# Altium footprint library PcbLib1.PcbLib: 45 footprints (part 2 of 3)
Each footprint in its own frame and in the unit in brackets; x right, y up, seen from the top. Pads: shape width x height; smd on the part's side, far side on the other; paste and mask are expansions set on the pad; w line width, h text height; cw(c..) or ccw(c..) is an arc to the next point about the centre after c.
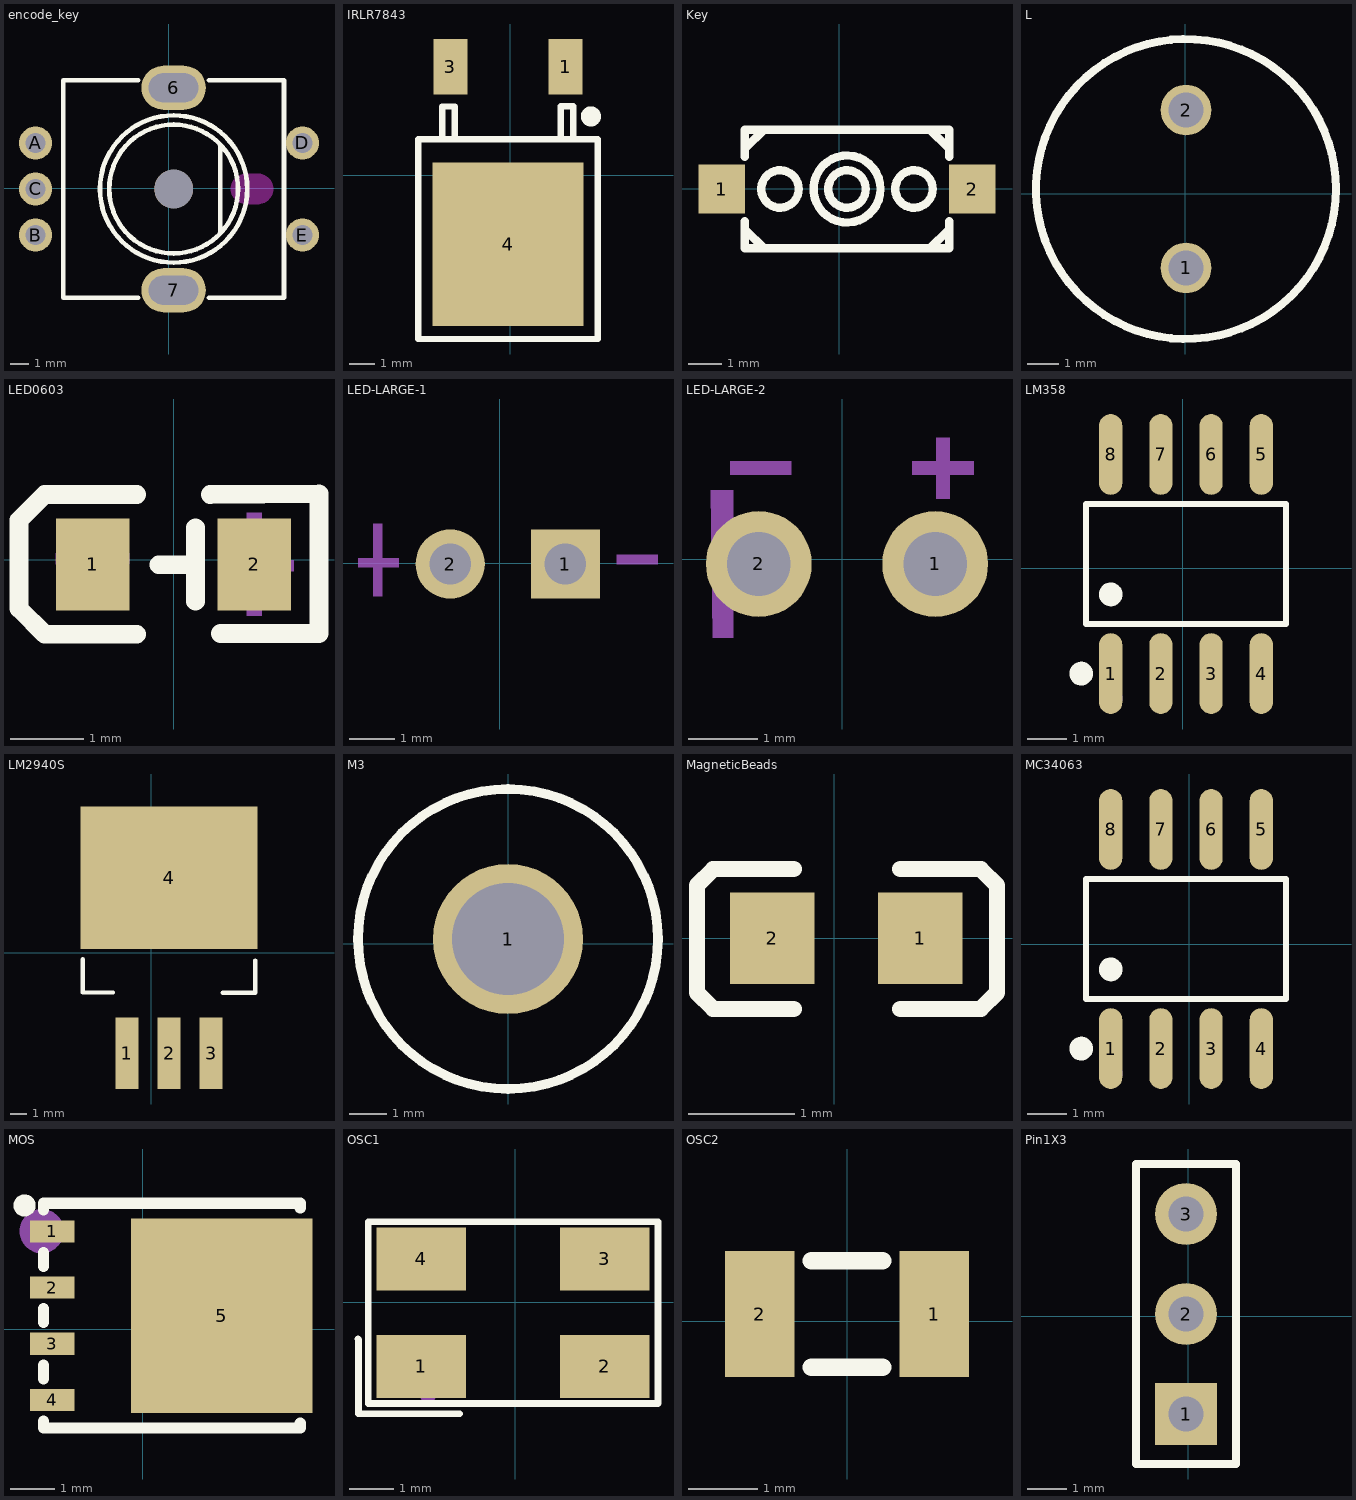
[diagram p1: the footprints below, top view; thin cyan lines are the x and y axes]

## encode_key [mm] "编码器开关"
pads (8):
  oval 3.5x2.4 hole 1.6 slot 2.7 at 0 deg: 6(0.253,5.449) 7(0.253,-5.551)
  round 1.8 hole 1.1: A(-7.247,2.449) B(-7.247,-2.551) C(-7.247,-0.051) D(7.253,2.449) E(7.253,-2.551)
  round 2.1 hole 2.1 unplated: ""(0.253,-0.051)
Top Overlay:
  circle w0.254: c0.253,-0.051 r4
  circle w0.254: c0.253,-0.051 r3.5
  lines w0.254: -5.747,5.849 -5.747,-5.951 -1.671,-5.951 ; -5.677,5.849 -1.671,5.849 ; 2.177,-5.951 6.253,-5.951 6.253,5.849 2.177,5.849 ; 2.793,-2.371 2.793,2.359
Keep-Out Layer:
  board cut-out: 4.133,0.779 4.895,0.779 4.998,0.771 5.194,0.704 5.368,0.591 5.508,0.439 5.606,0.258 5.657,0.057 5.657,-0.15 5.606,-0.35 5.508,-0.532 5.368,-0.684 5.194,-0.797 4.998,-0.864 4.895,-0.872 4.133,-0.872 4.03,-0.864 3.834,-0.797 3.661,-0.684 3.521,-0.532 3.422,-0.35 3.371,-0.15 3.371,0.057 3.422,0.258 3.521,0.439 3.661,0.591 3.834,0.704 4.03,0.771
3D body "SW5.step": height 21.49, standoff -3.51, extent -7.514,-6.865 7.386,5.976
3D body: height 0.25, standoff 0, extent 0,-0.508 0.254,-0.127

## IRLR7843 [mm]
pads (3):
  rect 1.35x2.2 smd: 1(2.206,4.319) 3(-2.374,4.319)
  rect 6x6.5 smd: 4(-0.084,-2.748)
Top Overlay:
  lines w0.254: -2.707,1.433 -2.707,2.733 -2.207,2.733 -2.207,1.433 ; 2.016,1.437 2.016,2.737 2.516,2.737 2.516,1.437 ; -3.657,-6.513 -3.657,1.437 3.489,1.437 3.489,-6.513 -3.657,-6.513
  lines w0.4: 3.015,2.338 ccw(c3.215,2.339) 3.015,2.34
Mechanical 15:
  circle w0.3: c2.329,4.799 r0.15
3D body "IRLR7843.step": height -0.64, standoff -2.94, extent -3.298,-5.406 3.202,4.513

## Key [mm]
pads (2):
  rect 1.4x1.5 smd: 1(-3.571,0) 2(4.029,0)
Top Overlay:
  circle w0.254: c0.229,0 r0.568
  circle w0.254: c0.229,0 r1.016
  circle w0.254: c2.261,0 r0.568
  circle w0.254: c-1.803,0 r0.568
  lines w0.254: -2.871,-0.981 -2.871,-1.8 3.329,-1.8 3.329,-0.981 ; -2.871,0.981 -2.871,1.8 3.329,1.8 3.329,0.981 ; -2.819,-1.27 -2.311,-1.778 ; -2.819,1.27 -2.311,1.778 ; 2.769,-1.778 3.277,-1.27 ; 2.769,1.778 3.277,1.27
3D body "SW3.step": height 2.6, standoff 0, extent -3.632,-1.927 4.268,1.674
3D body: height 0.25, standoff 0, extent -4.445,-1.778 -4.445,-1.778

## L [mm]
pads (2):
  round 1.6 hole 1.1: 1(0.02,-2.355) 2(0.02,2.645)
Top Overlay:
  circle w0.254: c0.02,0.145 r4.75
3D body "L.step": height 12.5, standoff -5, extent -4.704,-4.613 4.806,4.887

## LED0603 [mm]
pads (2):
  rect 1x1.25 smd: 1(-1.104,-0.061) 2(1.096,-0.061)
Top Overlay:
  lines w0.254: -0.504,-1.011 -1.754,-1.011 ; -0.504,0.889 -1.754,0.889 ; -0.204,-0.066 0.296,-0.066 ; 0.296,-0.561 0.296,0.439 ; 0.496,0.889 1.976,0.899 1.976,-1.001 0.636,-1.001 ; -1.754,-1.011 -2.104,-0.661 -2.104,0.539 -1.754,0.889 ; -1.754,-1.011 -1.754,-1.011 ; -1.754,0.889 -1.754,0.889
Mechanical 15:
  region: -1.604,-0.061 -0.604,-0.061 -0.604,0.089 -1.604,0.089
  region: 0.631,-0.155 1.631,-0.155 1.631,-0.005 0.631,-0.005
  region: 0.996,0.639 1.196,0.639 1.196,-0.761 0.996,-0.761
3D body "LED3.step": height 1.01, standoff 0, extent -1.01,-0.752 1.01,0.508

## LED-LARGE-1 [mil]
pads (2):
  rect 60x60 hole 36: 1(56.95,-0.6)
  round 60 hole 36: 2(-43.05,-0.6)
Bottom Overlay:
  circle w7.87: c6.95,-0.6 r86.61
  region: -102.02,34.56 -109.89,34.56 -109.89,-28.43 -102.02,-28.43
  region: 137.25,7.56 101.82,7.56 101.82,-0.32 137.25,-0.32
  region: -87.46,4.91 -122.89,4.91 -122.89,-2.97 -87.46,-2.97
  lines w10: -18.05,49.4 -18.05,64.4 ; -3.05,64.4 -8.05,64.4 -18.05,64.4 ; 1.95,44.4 -18.05,64.4 ; 16.95,49.4 16.95,64.4 ; 31.95,64.4 26.95,64.4 16.95,64.4 ; 36.95,44.4 16.95,64.4
Mechanical 15:
  region: 136.87,7.27 101.44,7.27 101.44,-0.6 136.87,-0.6
  region: -87.62,4.46 -123.05,4.46 -123.05,-3.42 -87.62,-3.42
  region: -101.84,34.28 -109.71,34.28 -109.71,-28.71 -101.84,-28.71
3D body "LED_LARGE1.step": height 117.8, standoff -236.53, extent -54.55,-78.56 87.12,74.76

## LED-LARGE-2 [mil]
pads (2):
  round 60 hole 36: 1(52.71,-2.7) 2(-47.29,-2.7)
Bottom Overlay:
  lines w10: -69.36,29.56 -69.36,42.37 cw(c2.7,-2.7) 83.97,22.22 ; -68.52,-35.52 -68.37,-47.12 ccw(c2.71,-2.7) 82.71,-27.7 ; -44.65,32.54 cw(c2.7,-2.7) 47.82,35.37 ; -42.52,-40.74 ccw(c2.71,-2.7) 48.9,-39.55
Mechanical 15:
  region: -61.86,39.03 -61.86,-44.43 -73.28,-44.43 -73.28,-44.04 -74.46,39.03
  region: 39.81,55.41 74.46,55.41 74.46,47.93 39.81,47.93
  region: 60.86,68.97 60.86,34.33 53.38,34.33 53.38,68.97
  region: -63.44,55.41 -28.79,55.41 -28.79,47.93 -63.44,47.93
3D body "LED_LARGE2.step": height 117.8, standoff -236.53, extent -76.64,-80.66 65.03,72.67

## LM358 [mm]
pads (8):
  oval 0.588x2.045 smd: 1(-1.819,-2.671) 2(-0.549,-2.671) 3(0.721,-2.671) 4(1.991,-2.671) 5(1.991,2.874) 6(0.721,2.874) 7(-0.549,2.874) 8(-1.819,2.874)
Top Overlay:
  circle w0.3: c-1.819,-0.668 r0.15
  circle w0.3: c-2.565,-2.671 r0.15
  lines w0.152: -2.44,-1.42 -2.44,1.623 2.613,1.623 2.613,-1.42 -2.44,-1.42
Mechanical 15:
  circle w0.3: c-1.819,-3.298 r0.15
3D body "LM358D.step": height 1.72, standoff 0, extent -2.334,-2.896 2.481,3.104

## LM2940S [mm]
pads (4):
  rect 1.4x4.3 smd: 1(-1.466,-6.073) 2(1.074,-6.073) 3(3.614,-6.073)
  rect 10.7x8.6 smd: 4(1.074,4.527)
Top Overlay:
  lines w0.254: -4.126,-0.393 -4.126,-2.393 -2.306,-2.393 ; 4.314,-2.413 6.274,-2.413 6.274,-0.473
Mechanical 15:
  circle w0.6: c-1.446,-7.553 r0.3
3D body "LM2940S.step": height 4.5, standoff 0, extent -4.053,-6.568 6.147,7.66

## M3 [mm]
pads (1):
  round 4 hole 3: 1(0,0.127)
Top Overlay:
  circle w0.254: c0,0.127 r4
3D body: height 10, standoff 0, extent -2.54,-2.41 2.54,2.664

## MagneticBeads [mm]
pads (2):
  rect 0.8x0.864 smd: 1(0.816,0) 2(-0.584,0)
Top Overlay:
  lines w0.152: -0.381,-0.67 -1.143,-0.67 -1.295,-0.517 -1.295,0.499 -1.143,0.652 -0.381,0.652 ; 0.625,-0.67 1.387,-0.67 1.54,-0.517 1.54,0.499 1.387,0.652 0.625,0.652
Top Paste:
  region: -0.148,-0.154 -0.148,0.122 -0.423,0.416 -0.926,0.416 -0.99,0.352 -0.99,-0.384 -0.926,-0.448 -0.423,-0.448
  region: 0.367,-0.143 0.367,0.134 0.642,0.427 1.145,0.427 1.209,0.363 1.209,-0.373 1.145,-0.437 0.642,-0.437
3D body "L3.step": height 0.5, standoff 0, extent -0.67,-0.384 0.93,0.416

## MC34063 [mm]
pads (8):
  oval 0.588x2.045 smd: 1(-1.981,-2.639) 2(-0.711,-2.639) 3(0.559,-2.639) 4(1.829,-2.639) 5(1.829,2.906) 6(0.559,2.906) 7(-0.711,2.906) 8(-1.981,2.906)
Top Overlay:
  circle w0.3: c-1.981,-0.635 r0.15
  circle w0.3: c-2.728,-2.639 r0.15
  lines w0.152: -2.602,-1.388 -2.602,1.655 2.45,1.655 2.45,-1.388 -2.602,-1.388
Mechanical 15:
  circle w0.3: c-1.981,-3.266 r0.15
3D body "MC34063.step": height 1.72, standoff 0, extent -2.461,-2.809 2.354,3.191

## MOS [mm]
pads (6):
  rect 1x0.5 smd: 1(-2.051,2.21) 2(-2.051,0.94) 3(-2.051,-0.33) 4(-2.051,-1.6)
  round 0 smd: 5(1.499,0.305)
  rect 4.1x4.4 smd: 5(1.778,0.305)
Top Overlay:
  circle w0.25: c-2.677,2.795 r0.125
  lines w0.254: -2.246,-2.081 -2.246,-2.235 -1.891,-2.235 ; -2.246,-1.119 -2.246,-0.811 ; -2.246,0.151 -2.246,0.459 ; -2.246,1.421 -2.246,1.729 ; -2.246,2.691 -2.246,2.845 -1.891,2.845 3.189,2.845 3.554,2.845 3.554,2.736 ; 3.554,-2.126 3.554,-2.235 3.189,-2.235 ; 3.554,-1.064 3.554,-0.826 ; 3.554,0.136 3.554,0.474 ; 3.554,1.436 3.554,1.674 ; -1.891,-2.235 -1.891,-2.235 ; -1.891,-2.235 3.189,-2.235 ; 3.189,-2.235 3.189,-2.235
Top Paste:
  region: -2.551,-1.35 -1.551,-1.35 -1.551,-1.85 -2.551,-1.85
  region: -2.551,-0.08 -1.551,-0.08 -1.551,-0.58 -2.551,-0.58
  region: -2.551,1.19 -1.551,1.19 -1.551,0.69 -2.551,0.69
  region: -2.551,2.46 -1.551,2.46 -1.551,1.96 -2.551,1.96
Mechanical 15:
  circle w0.5: c-2.286,2.215 r0.25
3D body "Q4.step": height 1.11, standoff 0, extent -2.236,-2.155 3.584,2.765

## OSC1 [mm]
pads (4):
  rect 2x1.4 smd: 1(-2.101,-1.429) 2(1.999,-1.429) 3(1.999,0.971) 4(-2.101,0.971)
Top Overlay:
  lines w0.152: -3.514,-0.819 -3.505,-0.828 -3.505,-2.487 -3.307,-2.487 -1.25,-2.487 ; -3.287,-2.258 -3.287,1.801 3.185,1.801 3.185,-2.258 -3.078,-2.258 -3.287,-2.258
Mechanical 15:
  circle w0.2: c-1.951,-2.029 r0.1
3D body "X2.step": height 1.12, standoff 0, extent -2.5,-1.728 2.5,1.473

## OSC2 [mm]
pads (2):
  rect 1x1.8 smd: 1(1.245,0.102) 2(-1.255,0.102)
Top Overlay:
  lines w0.254: -0.513,-0.66 0.503,-0.66 ; -0.513,0.864 0.503,0.864
3D body "X1.step": height 0.76, standoff 0, extent -1.6,-0.623 1.601,0.877
3D body: height 0.25, standoff 0, extent -0.572,1.397 -0.572,1.397

## Pin1X3 [mil]
pads (3):
  rect 62x62 hole 35: 1(-2.14,-98)
  round 62 hole 35: 2(-2.14,2) 3(-2.14,102)
Top Overlay:
  lines w7.99: 47.86,-73 47.86,152
  lines w8: 47.86,-73 47.86,-148 -52.14,-148 -52.14,152 47.86,152
3D body "J7.step": height 334.65, standoff -118.11, extent -52.15,-147.99 47.85,152.01